# Altium schematic symbol library jlcpcb_2025_04_capacitors_extended_0603.schlib: 3668 symbols (part 18 of 20) (continued)
## GRM1885C2A332JA01D
designator C?  Capacitance: 3.3nF  (hidden comment: *)
Capacitor, Ceramic (MLCC), 3.3nF, ±5%, 100V, ±5%, SMD 0603; Manufacturer: Murata Electronics; Manufacturer Part Number: GRM1885C2A332JA01D; Package Size: 0603; JLCPCB Basic Part: No; JLCPCB Part Number: C710910; Supplier 1: LCSC; Category: Capacitors - MLCC; Supplier Part Number 1: C710910; Tolerance: ±5%; Voltage Rating: 100V; RoHS: Yes; ComponentLink1Description: Datasheet; ComponentLink1URL: https://wmsc.lcsc.com/wmsc/upload/file/pdf/v2/lcsc/2109092030_Murata-Electronics-GRM1885C2A332JA01D_C710910.pdf; ComponentLink2Description: JLCPCB Part URL; ComponentLink2URL: https://jlcpcb.com/partdetail/C710910; ComponentLink3Description: LCSC Part URL; ComponentLink3URL: https://lcsc.com/product-detail/Multilayer-Ceramic-Capacitors-MLCC---SMD-SMT_Murata-Electronics-Murata-Electronics-GRM1885C2A332JA01D_C710910.html
footprint CAP-0603 (0603 (1608M) Capacitor)
pins: 1, 2

## GRM1885C2A390JA01D
designator C?  Capacitance: 39pF  (hidden comment: *)
Capacitor, Ceramic (MLCC), 39pF, ±5%, 100V, null, ±5%, SMD 0603; Manufacturer: Murata Electronics; Manufacturer Part Number: GRM1885C2A390JA01D; Package Size: 0603; JLCPCB Basic Part: No; JLCPCB Part Number: C913637; Supplier 1: LCSC; Category: Capacitors - MLCC; Supplier Part Number 1: C913637; Tolerance: ±5%; Voltage Rating: 100V; Temperature Coefficient: null; RoHS: Yes; ComponentLink1Description: Datasheet; ComponentLink1URL: https://wmsc.lcsc.com/wmsc/upload/file/pdf/v2/lcsc/2201131300_Murata-Electronics-GRM1885C2A390JA01D_C913637.pdf; ComponentLink2Description: JLCPCB Part URL; ComponentLink2URL: https://jlcpcb.com/partdetail/C913637; ComponentLink3Description: LCSC Part URL; ComponentLink3URL: https://lcsc.com/product-detail/Multilayer-Ceramic-Capacitors-MLCC---SMD-SMT_Murata-Electronics-Murata-Electronics-GRM1885C2A390JA01D_C913637.html
footprint CAP-0603 (0603 (1608M) Capacitor)
pins: 1, 2

## GRM1885C2A821JA01D
designator C?  Capacitance: 820pF  (hidden comment: *)
Capacitor, Ceramic (MLCC), 820pF, ±5%, 100V, C0G, ±5%, SMD 0603; Manufacturer: Murata Electronics; Manufacturer Part Number: GRM1885C2A821JA01D; Package Size: 0603; JLCPCB Basic Part: No; JLCPCB Part Number: C117954; Supplier 1: LCSC; Category: Capacitors - MLCC; Supplier Part Number 1: C117954; Tolerance: ±5%; Voltage Rating: 100V; Temperature Coefficient: C0G; RoHS: Yes; ComponentLink1Description: Datasheet; ComponentLink1URL: https://wmsc.lcsc.com/wmsc/upload/file/pdf/v2/lcsc/2008031207_Murata-Electronics-GRM1885C2A821JA01D_C117954.pdf; ComponentLink2Description: JLCPCB Part URL; ComponentLink2URL: https://jlcpcb.com/partdetail/C117954; ComponentLink3Description: LCSC Part URL; ComponentLink3URL: https://lcsc.com/product-detail/Multilayer-Ceramic-Capacitors-MLCC---SMD-SMT_Murata-Electronics-Murata-Electronics-GRM1885C2A821JA01D_C117954.html
footprint CAP-0603 (0603 (1608M) Capacitor)
pins: 1, 2

## GRM1885C2AR50BA01D
designator C?  Capacitance: 0.5pF  (hidden comment: *)
Capacitor, Ceramic (MLCC), 0.5pF, 100V, C0G, SMD 0603; Manufacturer: Murata Electronics; Manufacturer Part Number: GRM1885C2AR50BA01D; Package Size: 0603; JLCPCB Basic Part: No; JLCPCB Part Number: C524623; Supplier 1: LCSC; Category: Capacitors - MLCC; Supplier Part Number 1: C524623; Voltage Rating: 100V; Temperature Coefficient: C0G; RoHS: Yes; ComponentLink1Description: Datasheet; ComponentLink1URL: https://wmsc.lcsc.com/wmsc/upload/file/pdf/v2/lcsc/2304140030_Murata-Electronics-GRM1885C2AR50BA01D_C524623.pdf; ComponentLink2Description: JLCPCB Part URL; ComponentLink2URL: https://jlcpcb.com/partdetail/C524623; ComponentLink3Description: LCSC Part URL; ComponentLink3URL: https://lcsc.com/product-detail/Multilayer-Ceramic-Capacitors-MLCC---SMD-SMT_Murata-Electronics-Murata-Electronics-GRM1885C2AR50BA01D_C524623.html
footprint CAP-0603 (0603 (1608M) Capacitor)
pins: 1, 2

## GRM1885C2AR50CA01D
designator C?  Capacitance: 0.5pF  (hidden comment: *)
Capacitor, Ceramic (MLCC), 0.5pF, 100V, C0G, SMD 0603; Manufacturer: Murata Electronics; Manufacturer Part Number: GRM1885C2AR50CA01D; Package Size: 0603; JLCPCB Basic Part: No; JLCPCB Part Number: C692633; Supplier 1: LCSC; Category: Capacitors - MLCC; Supplier Part Number 1: C692633; Voltage Rating: 100V; Temperature Coefficient: C0G; RoHS: Yes; ComponentLink1Description: Datasheet; ComponentLink2Description: JLCPCB Part URL; ComponentLink2URL: https://jlcpcb.com/partdetail/C692633; ComponentLink3Description: LCSC Part URL; ComponentLink3URL: https://lcsc.com/product-detail/Multilayer-Ceramic-Capacitors-MLCC---SMD-SMT_Murata-Electronics-Murata-Electronics-GRM1885C2AR50CA01D_C692633.html
footprint CAP-0603 (0603 (1608M) Capacitor)
pins: 1, 2

## GRM1885C2E470JW07D
designator C?  Capacitance: 47pF  (hidden comment: *)
Capacitor, Ceramic (MLCC), 47pF, ±5%, 250V, ±5%, SMD 0603; Manufacturer: Murata Electronics; Manufacturer Part Number: GRM1885C2E470JW07D; Package Size: 0603; JLCPCB Basic Part: No; JLCPCB Part Number: C907914; Supplier 1: LCSC; Category: Capacitors - MLCC; Supplier Part Number 1: C907914; Tolerance: ±5%; Voltage Rating: 250V; RoHS: Yes; ComponentLink1Description: Datasheet; ComponentLink1URL: https://wmsc.lcsc.com/wmsc/upload/file/pdf/v2/lcsc/2201242100_Murata-Electronics-GRM1885C2E470JW07D_C907914.pdf; ComponentLink2Description: JLCPCB Part URL; ComponentLink2URL: https://jlcpcb.com/partdetail/C907914; ComponentLink3Description: LCSC Part URL; ComponentLink3URL: https://lcsc.com/product-detail/Multilayer-Ceramic-Capacitors-MLCC---SMD-SMT_Murata-Electronics-Murata-Electronics-GRM1885C2E470JW07D_C907914.html
footprint CAP-0603 (0603 (1608M) Capacitor)
pins: 1, 2

## GRM1887U1H102JA01D
designator C?  Capacitance: 1nF  (hidden comment: *)
Capacitor, Ceramic (MLCC), 1nF, ±5%, 50V, U2J, ±5%, SMD 0603; Manufacturer: Murata Electronics; Manufacturer Part Number: GRM1887U1H102JA01D; Package Size: 0603; JLCPCB Basic Part: No; JLCPCB Part Number: C162262; Supplier 1: LCSC; Category: Capacitors - MLCC; Supplier Part Number 1: C162262; Tolerance: ±5%; Voltage Rating: 50V; Temperature Coefficient: U2J; RoHS: Yes; ComponentLink1Description: Datasheet; ComponentLink1URL: https://wmsc.lcsc.com/wmsc/upload/file/pdf/v2/lcsc/2304140030_Murata-Electronics-GRM1887U1H102JA01D_C162262.pdf; ComponentLink2Description: JLCPCB Part URL; ComponentLink2URL: https://jlcpcb.com/partdetail/C162262; ComponentLink3Description: LCSC Part URL; ComponentLink3URL: https://lcsc.com/product-detail/Multilayer-Ceramic-Capacitors-MLCC---SMD-SMT_Murata-Electronics-Murata-Electronics-GRM1887U1H102JA01D_C162262.html
footprint CAP-0603 (0603 (1608M) Capacitor)
pins: 1, 2

## GRM1887U1H103JA01D
designator C?  Capacitance: 10nF  (hidden comment: *)
Capacitor, Ceramic (MLCC), 10nF, ±5%, null, U2J, ±5%, SMD 0603; Manufacturer: Murata Electronics; Manufacturer Part Number: GRM1887U1H103JA01D; Package Size: 0603; JLCPCB Basic Part: No; JLCPCB Part Number: C783279; Supplier 1: LCSC; Category: Capacitors - MLCC; Supplier Part Number 1: C783279; Tolerance: ±5%; Voltage Rating: null; Temperature Coefficient: U2J; RoHS: Yes; ComponentLink1Description: Datasheet; ComponentLink1URL: https://wmsc.lcsc.com/wmsc/upload/file/pdf/v2/lcsc/2304140030_Murata-Electronics-GRM1887U1H103JA01D_C783279.pdf; ComponentLink2Description: JLCPCB Part URL; ComponentLink2URL: https://jlcpcb.com/partdetail/C783279; ComponentLink3Description: LCSC Part URL; ComponentLink3URL: https://lcsc.com/product-detail/Multilayer-Ceramic-Capacitors-MLCC---SMD-SMT_Murata-Electronics-Murata-Electronics-GRM1887U1H103JA01D_C783279.html
footprint CAP-0603 (0603 (1608M) Capacitor)
pins: 1, 2

## GRT188C8YA105KE13D
designator C?  Capacitance: 1uF  (hidden comment: *)
Capacitor, Ceramic (MLCC), 1uF, ±10%, 35V, X6S, ±10%, SMD 0603; Manufacturer: Murata Electronics; Manufacturer Part Number: GRT188C8YA105KE13D; Package Size: 0603; JLCPCB Basic Part: No; JLCPCB Part Number: C711096; Supplier 1: LCSC; Category: Capacitors - MLCC; Supplier Part Number 1: C711096; Tolerance: ±10%; Voltage Rating: 35V; Temperature Coefficient: X6S; RoHS: Yes; ComponentLink1Description: Datasheet; ComponentLink1URL: https://wmsc.lcsc.com/wmsc/upload/file/pdf/v2/lcsc/2210190600_Murata-Electronics-GRT188C8YA105KE13D_C711096.pdf; ComponentLink2Description: JLCPCB Part URL; ComponentLink2URL: https://jlcpcb.com/partdetail/C711096; ComponentLink3Description: LCSC Part URL; ComponentLink3URL: https://lcsc.com/product-detail/Multilayer-Ceramic-Capacitors-MLCC---SMD-SMT_Murata-Electronics-Murata-Electronics-GRT188C8YA105KE13D_C711096.html
footprint CAP-0603 (0603 (1608M) Capacitor)
pins: 1, 2

## GRT188C8YA225KE13D
designator C?  Capacitance: 2.2uF  (hidden comment: *)
Capacitor, Ceramic (MLCC), 2.2uF, ±10%, 35V, X6S, ±10%, SMD 0603; Manufacturer: Murata Electronics; Manufacturer Part Number: GRT188C8YA225KE13D; Package Size: 0603; JLCPCB Basic Part: No; JLCPCB Part Number: C711097; Supplier 1: LCSC; Category: Capacitors - MLCC; Supplier Part Number 1: C711097; Tolerance: ±10%; Voltage Rating: 35V; Temperature Coefficient: X6S; RoHS: Yes; ComponentLink1Description: Datasheet; ComponentLink1URL: https://wmsc.lcsc.com/wmsc/upload/file/pdf/v2/lcsc/2210190600_Murata-Electronics-GRT188C8YA225KE13D_C711097.pdf; ComponentLink2Description: JLCPCB Part URL; ComponentLink2URL: https://jlcpcb.com/partdetail/C711097; ComponentLink3Description: LCSC Part URL; ComponentLink3URL: https://lcsc.com/product-detail/Multilayer-Ceramic-Capacitors-MLCC---SMD-SMT_Murata-Electronics-Murata-Electronics-GRT188C8YA225KE13D_C711097.html
footprint CAP-0603 (0603 (1608M) Capacitor)
pins: 1, 2

## GRT188C71C225KE13D
designator C?  Capacitance: 2.2uF  (hidden comment: *)
Capacitor, Ceramic (MLCC), 2.2uF, ±10%, 16V, ±10%, SMD 0603; Manufacturer: Murata Electronics; Manufacturer Part Number: GRT188C71C225KE13D; Package Size: 0603; JLCPCB Basic Part: No; JLCPCB Part Number: C883577; Supplier 1: LCSC; Category: Capacitors - MLCC; Supplier Part Number 1: C883577; Tolerance: ±10%; Voltage Rating: 16V; RoHS: Yes; ComponentLink1Description: Datasheet; ComponentLink1URL: https://wmsc.lcsc.com/wmsc/upload/file/pdf/v2/lcsc/2304140030_Murata-Electronics-GRT188C71C225KE13D_C883577.pdf; ComponentLink2Description: JLCPCB Part URL; ComponentLink2URL: https://jlcpcb.com/partdetail/C883577; ComponentLink3Description: LCSC Part URL; ComponentLink3URL: https://lcsc.com/product-detail/Multilayer-Ceramic-Capacitors-MLCC---SMD-SMT_Murata-Electronics-Murata-Electronics-GRT188C71C225KE13D_C883577.html
footprint CAP-0603 (0603 (1608M) Capacitor)
pins: 1, 2

## GRT188C71C475KE13D
designator C?  Capacitance: 4.7uF  (hidden comment: *)
Capacitor, Ceramic (MLCC), 4.7uF, ±10%, 16V, X7S, ±10%, SMD 0603; Manufacturer: Murata Electronics; Manufacturer Part Number: GRT188C71C475KE13D; Package Size: 0603; JLCPCB Basic Part: No; JLCPCB Part Number: C5160228; Supplier 1: LCSC; Category: Capacitors - MLCC; Supplier Part Number 1: C5160228; Tolerance: ±10%; Voltage Rating: 16V; Temperature Coefficient: X7S; RoHS: Yes; ComponentLink1Description: Datasheet; ComponentLink1URL: https://wmsc.lcsc.com/wmsc/upload/file/pdf/v2/lcsc/2209141730_Murata-Electronics-GRT188C71C475KE13D_C5160228.pdf; ComponentLink2Description: JLCPCB Part URL; ComponentLink2URL: https://jlcpcb.com/partdetail/C5160228; ComponentLink3Description: LCSC Part URL; ComponentLink3URL: https://lcsc.com/product-detail/Multilayer-Ceramic-Capacitors-MLCC---SMD-SMT_Murata-Electronics-Murata-Electronics-GRT188C71C475KE13D_C5160228.html
footprint CAP-0603 (0603 (1608M) Capacitor)
pins: 1, 2

## GRT188C71E225KE13D
designator C?  Capacitance: 2.2uF  (hidden comment: *)
Capacitor, Ceramic (MLCC), 2.2uF, ±10%, 25V, X7S, ±10%, SMD 0603; Manufacturer: Murata Electronics; Manufacturer Part Number: GRT188C71E225KE13D; Package Size: 0603; JLCPCB Basic Part: No; JLCPCB Part Number: C5299755; Supplier 1: LCSC; Category: Capacitors - MLCC; Supplier Part Number 1: C5299755; Tolerance: ±10%; Voltage Rating: 25V; Temperature Coefficient: X7S; RoHS: Yes; ComponentLink1Description: Datasheet; ComponentLink1URL: https://wmsc.lcsc.com/wmsc/upload/file/pdf/v2/lcsc/2212191030_Murata-Electronics-GRT188C71E225KE13D_C5299755.pdf; ComponentLink2Description: JLCPCB Part URL; ComponentLink2URL: https://jlcpcb.com/partdetail/C5299755; ComponentLink3Description: LCSC Part URL; ComponentLink3URL: https://lcsc.com/product-detail/Multilayer-Ceramic-Capacitors-MLCC---SMD-SMT_Murata-Electronics-Murata-Electronics-GRT188C71E225KE13D_C5299755.html
footprint CAP-0603 (0603 (1608M) Capacitor)
pins: 1, 2

## GRT188C80J106ME13D
designator C?  Capacitance: 10uF  (hidden comment: *)
Capacitor, Ceramic (MLCC), 10uF, 6.3V, X6S, SMD 0603; Manufacturer: Murata Electronics; Manufacturer Part Number: GRT188C80J106ME13D; Package Size: 0603; JLCPCB Basic Part: No; JLCPCB Part Number: C2918259; Supplier 1: LCSC; Category: Capacitors - MLCC; Supplier Part Number 1: C2918259; Voltage Rating: 6.3V; Temperature Coefficient: X6S; RoHS: Yes; ComponentLink1Description: Datasheet; ComponentLink1URL: https://wmsc.lcsc.com/wmsc/upload/file/pdf/v2/lcsc/2111181830_Murata-Electronics-GRT188C80J106ME13D_C2918259.pdf; ComponentLink2Description: JLCPCB Part URL; ComponentLink2URL: https://jlcpcb.com/partdetail/C2918259; ComponentLink3Description: LCSC Part URL; ComponentLink3URL: https://lcsc.com/product-detail/Multilayer-Ceramic-Capacitors-MLCC---SMD-SMT_Murata-Electronics-Murata-Electronics-GRT188C80J106ME13D_C2918259.html
footprint CAP-0603 (0603 (1608M) Capacitor)
pins: 1, 2

## GRT188C80J226ME13D
designator C?  Capacitance: 22uF  (hidden comment: *)
Capacitor, Ceramic (MLCC), 22uF, ±20%, 6.3V, X6S, ±20%, SMD 0603; Manufacturer: Murata Electronics; Manufacturer Part Number: GRT188C80J226ME13D; Package Size: 0603; JLCPCB Basic Part: No; JLCPCB Part Number: C703102; Supplier 1: LCSC; Category: Capacitors - MLCC; Supplier Part Number 1: C703102; Tolerance: ±20%; Voltage Rating: 6.3V; Temperature Coefficient: X6S; RoHS: Yes; ComponentLink1Description: Datasheet; ComponentLink1URL: https://wmsc.lcsc.com/wmsc/upload/file/pdf/v2/lcsc/2209061430_Murata-Electronics-GRT188C80J226ME13D_C703102.pdf; ComponentLink2Description: JLCPCB Part URL; ComponentLink2URL: https://jlcpcb.com/partdetail/C703102; ComponentLink3Description: LCSC Part URL; ComponentLink3URL: https://lcsc.com/product-detail/Multilayer-Ceramic-Capacitors-MLCC---SMD-SMT_Murata-Electronics-Murata-Electronics-GRT188C80J226ME13D_C703102.html
footprint CAP-0603 (0603 (1608M) Capacitor)
pins: 1, 2

## GRT188C80J475KE01D
designator C?  Capacitance: 4.7uF  (hidden comment: *)
Capacitor, Ceramic (MLCC), 4.7uF, ±10%, 6.3V, X6S, ±10%, SMD 0603; Manufacturer: Murata Electronics; Manufacturer Part Number: GRT188C80J475KE01D; Package Size: 0603; JLCPCB Basic Part: No; JLCPCB Part Number: C711094; Supplier 1: LCSC; Category: Capacitors - MLCC; Supplier Part Number 1: C711094; Tolerance: ±10%; Voltage Rating: 6.3V; Temperature Coefficient: X6S; RoHS: Yes; ComponentLink1Description: Datasheet; ComponentLink1URL: https://wmsc.lcsc.com/wmsc/upload/file/pdf/v2/lcsc/2308111644_Murata-Electronics-GRT188C80J475KE01D_C711094.pdf; ComponentLink2Description: JLCPCB Part URL; ComponentLink2URL: https://jlcpcb.com/partdetail/C711094; ComponentLink3Description: LCSC Part URL; ComponentLink3URL: https://lcsc.com/product-detail/Multilayer-Ceramic-Capacitors-MLCC---SMD-SMT_Murata-Electronics-Murata-Electronics-GRT188C80J475KE01D_C711094.html
footprint CAP-0603 (0603 (1608M) Capacitor)
pins: 1, 2

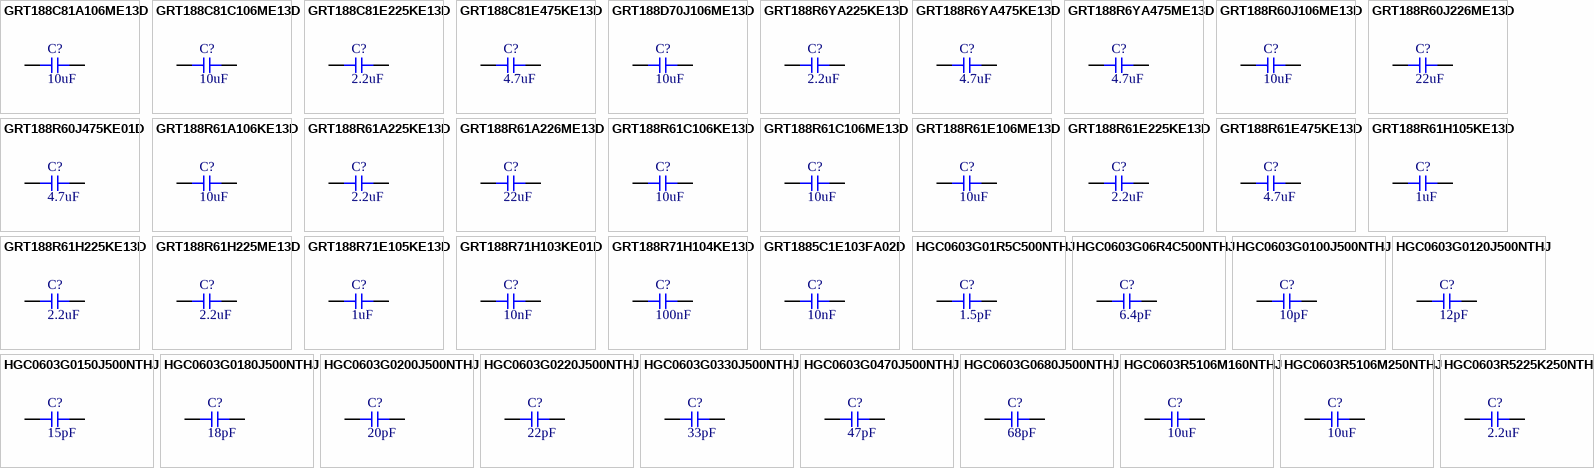
[diagram p80: symbols GRT188C81A106ME13D to HGC0603R5225K250NTHJ]

## GRT188C81A106ME13D
designator C?  Capacitance: 10uF  (hidden comment: *)
Capacitor, Ceramic (MLCC), 10uF, ±20%, 10V, X6S, ±20%, SMD 0603; Manufacturer: Murata Electronics; Manufacturer Part Number: GRT188C81A106ME13D; Package Size: 0603; JLCPCB Basic Part: No; JLCPCB Part Number: C711095; Supplier 1: LCSC; Category: Capacitors - MLCC; Supplier Part Number 1: C711095; Tolerance: ±20%; Voltage Rating: 10V; Temperature Coefficient: X6S; RoHS: Yes; ComponentLink1Description: Datasheet; ComponentLink1URL: https://wmsc.lcsc.com/wmsc/upload/file/pdf/v2/lcsc/2108182030_Murata-Electronics-GRT188C81A106ME13D_C711095.pdf; ComponentLink2Description: JLCPCB Part URL; ComponentLink2URL: https://jlcpcb.com/partdetail/C711095; ComponentLink3Description: LCSC Part URL; ComponentLink3URL: https://lcsc.com/product-detail/Multilayer-Ceramic-Capacitors-MLCC---SMD-SMT_Murata-Electronics-Murata-Electronics-GRT188C81A106ME13D_C711095.html
footprint CAP-0603 (0603 (1608M) Capacitor)
pins: 1, 2

## GRT188C81C106ME13D
designator C?  Capacitance: 10uF  (hidden comment: *)
Capacitor, Ceramic (MLCC), 10uF, ±20%, 16V, ±20%, SMD 0603; Manufacturer: Murata Electronics; Manufacturer Part Number: GRT188C81C106ME13D; Package Size: 0603; JLCPCB Basic Part: No; JLCPCB Part Number: C703081; Supplier 1: LCSC; Category: Capacitors - MLCC; Supplier Part Number 1: C703081; Tolerance: ±20%; Voltage Rating: 16V; RoHS: Yes; ComponentLink1Description: Datasheet; ComponentLink1URL: https://wmsc.lcsc.com/wmsc/upload/file/pdf/v2/lcsc/2308111644_Murata-Electronics-GRT188C81C106ME13D_C703081.pdf; ComponentLink2Description: JLCPCB Part URL; ComponentLink2URL: https://jlcpcb.com/partdetail/C703081; ComponentLink3Description: LCSC Part URL; ComponentLink3URL: https://lcsc.com/product-detail/Multilayer-Ceramic-Capacitors-MLCC---SMD-SMT_Murata-Electronics-Murata-Electronics-GRT188C81C106ME13D_C703081.html
footprint CAP-0603 (0603 (1608M) Capacitor)
pins: 1, 2

## GRT188C81E225KE13D
designator C?  Capacitance: 2.2uF  (hidden comment: *)
Capacitor, Ceramic (MLCC), 2.2uF, ±10%, 25V, X6S, ±10%, SMD 0603; Manufacturer: Murata Electronics; Manufacturer Part Number: GRT188C81E225KE13D; Package Size: 0603; JLCPCB Basic Part: No; JLCPCB Part Number: C907915; Supplier 1: LCSC; Category: Capacitors - MLCC; Supplier Part Number 1: C907915; Tolerance: ±10%; Voltage Rating: 25V; Temperature Coefficient: X6S; RoHS: Yes; ComponentLink1Description: Datasheet; ComponentLink1URL: https://wmsc.lcsc.com/wmsc/upload/file/pdf/v2/lcsc/2304140030_Murata-Electronics-GRT188C81E225KE13D_C907915.pdf; ComponentLink2Description: JLCPCB Part URL; ComponentLink2URL: https://jlcpcb.com/partdetail/C907915; ComponentLink3Description: LCSC Part URL; ComponentLink3URL: https://lcsc.com/product-detail/Multilayer-Ceramic-Capacitors-MLCC---SMD-SMT_Murata-Electronics-Murata-Electronics-GRT188C81E225KE13D_C907915.html
footprint CAP-0603 (0603 (1608M) Capacitor)
pins: 1, 2

## GRT188C81E475KE13D
designator C?  Capacitance: 4.7uF  (hidden comment: *)
Capacitor, Ceramic (MLCC), 4.7uF, ±10%, 25V, ±10%, SMD 0603; Manufacturer: Murata Electronics; Manufacturer Part Number: GRT188C81E475KE13D; Package Size: 0603; JLCPCB Basic Part: No; JLCPCB Part Number: C907917; Supplier 1: LCSC; Category: Capacitors - MLCC; Supplier Part Number 1: C907917; Tolerance: ±10%; Voltage Rating: 25V; RoHS: Yes; ComponentLink1Description: Datasheet; ComponentLink1URL: https://wmsc.lcsc.com/wmsc/upload/file/pdf/v2/lcsc/2304140030_Murata-Electronics-GRT188C81E475KE13D_C907917.pdf; ComponentLink2Description: JLCPCB Part URL; ComponentLink2URL: https://jlcpcb.com/partdetail/C907917; ComponentLink3Description: LCSC Part URL; ComponentLink3URL: https://lcsc.com/product-detail/Multilayer-Ceramic-Capacitors-MLCC---SMD-SMT_Murata-Electronics-Murata-Electronics-GRT188C81E475KE13D_C907917.html
footprint CAP-0603 (0603 (1608M) Capacitor)
pins: 1, 2

## GRT188D70J106ME13D
designator C?  Capacitance: 10uF  (hidden comment: *)
Capacitor, Ceramic (MLCC), 10uF, ±20%, 6.3V, X7T, ±20%, SMD 0603; Manufacturer: Murata Electronics; Manufacturer Part Number: GRT188D70J106ME13D; Package Size: 0603; JLCPCB Basic Part: No; JLCPCB Part Number: C3907775; Supplier 1: LCSC; Category: Capacitors - MLCC; Supplier Part Number 1: C3907775; Tolerance: ±20%; Voltage Rating: 6.3V; Temperature Coefficient: X7T; RoHS: Yes; ComponentLink1Description: Datasheet; ComponentLink1URL: https://wmsc.lcsc.com/wmsc/upload/file/pdf/v2/lcsc/2308111808_Murata-Electronics-GRT188D70J106ME13D_C3907775.pdf; ComponentLink2Description: JLCPCB Part URL; ComponentLink2URL: https://jlcpcb.com/partdetail/C3907775; ComponentLink3Description: LCSC Part URL; ComponentLink3URL: https://lcsc.com/product-detail/Multilayer-Ceramic-Capacitors-MLCC---SMD-SMT_Murata-Electronics-Murata-Electronics-GRT188D70J106ME13D_C3907775.html
footprint CAP-0603 (0603 (1608M) Capacitor)
pins: 1, 2

## GRT188R6YA225KE13D
designator C?  Capacitance: 2.2uF  (hidden comment: *)
Capacitor, Ceramic (MLCC), 2.2uF, ±10%, 35V, X5R, ±10%, SMD 0603; Manufacturer: Murata Electronics; Manufacturer Part Number: GRT188R6YA225KE13D; Package Size: 0603; JLCPCB Basic Part: No; JLCPCB Part Number: C711099; Supplier 1: LCSC; Category: Capacitors - MLCC; Supplier Part Number 1: C711099; Tolerance: ±10%; Voltage Rating: 35V; Temperature Coefficient: X5R; RoHS: Yes; ComponentLink1Description: Datasheet; ComponentLink1URL: https://wmsc.lcsc.com/wmsc/upload/file/pdf/v2/lcsc/2210190600_Murata-Electronics-GRT188R6YA225KE13D_C711099.pdf; ComponentLink2Description: JLCPCB Part URL; ComponentLink2URL: https://jlcpcb.com/partdetail/C711099; ComponentLink3Description: LCSC Part URL; ComponentLink3URL: https://lcsc.com/product-detail/Multilayer-Ceramic-Capacitors-MLCC---SMD-SMT_Murata-Electronics-Murata-Electronics-GRT188R6YA225KE13D_C711099.html
footprint CAP-0603 (0603 (1608M) Capacitor)
pins: 1, 2

## GRT188R6YA475KE13D
designator C?  Capacitance: 4.7uF  (hidden comment: *)
Capacitor, Ceramic (MLCC), 4.7uF, ±10%, 35V, X5R, ±10%, SMD 0603; Manufacturer: Murata Electronics; Manufacturer Part Number: GRT188R6YA475KE13D; Package Size: 0603; JLCPCB Basic Part: No; JLCPCB Part Number: C711100; Supplier 1: LCSC; Category: Capacitors - MLCC; Supplier Part Number 1: C711100; Tolerance: ±10%; Voltage Rating: 35V; Temperature Coefficient: X5R; RoHS: Yes; ComponentLink1Description: Datasheet; ComponentLink1URL: https://wmsc.lcsc.com/wmsc/upload/file/pdf/v2/lcsc/2204211715_Murata-Electronics-GRT188R6YA475KE13D_C711100.pdf; ComponentLink2Description: JLCPCB Part URL; ComponentLink2URL: https://jlcpcb.com/partdetail/C711100; ComponentLink3Description: LCSC Part URL; ComponentLink3URL: https://lcsc.com/product-detail/Multilayer-Ceramic-Capacitors-MLCC---SMD-SMT_Murata-Electronics-Murata-Electronics-GRT188R6YA475KE13D_C711100.html
footprint CAP-0603 (0603 (1608M) Capacitor)
pins: 1, 2

## GRT188R6YA475ME13D
designator C?  Capacitance: 4.7uF  (hidden comment: *)
Capacitor, Ceramic (MLCC), 4.7uF, ±20%, 35V, X5R, ±20%, SMD 0603; Manufacturer: Murata Electronics; Manufacturer Part Number: GRT188R6YA475ME13D; Package Size: 0603; JLCPCB Basic Part: No; JLCPCB Part Number: C907729; Supplier 1: LCSC; Category: Capacitors - MLCC; Supplier Part Number 1: C907729; Tolerance: ±20%; Voltage Rating: 35V; Temperature Coefficient: X5R; RoHS: Yes; ComponentLink1Description: Datasheet; ComponentLink1URL: https://wmsc.lcsc.com/wmsc/upload/file/pdf/v2/lcsc/2304140030_Murata-Electronics-GRT188R6YA475ME13D_C907729.pdf; ComponentLink2Description: JLCPCB Part URL; ComponentLink2URL: https://jlcpcb.com/partdetail/C907729; ComponentLink3Description: LCSC Part URL; ComponentLink3URL: https://lcsc.com/product-detail/Multilayer-Ceramic-Capacitors-MLCC---SMD-SMT_Murata-Electronics-Murata-Electronics-GRT188R6YA475ME13D_C907729.html
footprint CAP-0603 (0603 (1608M) Capacitor)
pins: 1, 2

## GRT188R60J106ME13D
designator C?  Capacitance: 10uF  (hidden comment: *)
Capacitor, Ceramic (MLCC), 10uF, ±20%, 6.3V, X5R, ±20%, SMD 0603; Manufacturer: Murata Electronics; Manufacturer Part Number: GRT188R60J106ME13D; Package Size: 0603; JLCPCB Basic Part: No; JLCPCB Part Number: C193747; Supplier 1: LCSC; Category: Capacitors - MLCC; Supplier Part Number 1: C193747; Tolerance: ±20%; Voltage Rating: 6.3V; Temperature Coefficient: X5R; RoHS: Yes; ComponentLink1Description: Datasheet; ComponentLink1URL: https://wmsc.lcsc.com/wmsc/upload/file/pdf/v2/lcsc/2012231209_Murata-Electronics-GRT188R60J106ME13D_C193747.pdf; ComponentLink2Description: JLCPCB Part URL; ComponentLink2URL: https://jlcpcb.com/partdetail/C193747; ComponentLink3Description: LCSC Part URL; ComponentLink3URL: https://lcsc.com/product-detail/Multilayer-Ceramic-Capacitors-MLCC---SMD-SMT_Murata-Electronics-Murata-Electronics-GRT188R60J106ME13D_C193747.html
footprint CAP-0603 (0603 (1608M) Capacitor)
pins: 1, 2

## GRT188R60J226ME13D
designator C?  Capacitance: 22uF  (hidden comment: *)
Capacitor, Ceramic (MLCC), 22uF, ±20%, 6.3V, X5R, ±20%, SMD 0603; Manufacturer: Murata Electronics; Manufacturer Part Number: GRT188R60J226ME13D; Package Size: 0603; JLCPCB Basic Part: No; JLCPCB Part Number: C126628; Supplier 1: LCSC; Category: Capacitors - MLCC; Supplier Part Number 1: C126628; Tolerance: ±20%; Voltage Rating: 6.3V; Temperature Coefficient: X5R; RoHS: Yes; ComponentLink1Description: Datasheet; ComponentLink1URL: https://wmsc.lcsc.com/wmsc/upload/file/pdf/v2/lcsc/1810311135_Murata-Electronics-GRT188R60J226ME13D_C126628.pdf; ComponentLink2Description: JLCPCB Part URL; ComponentLink2URL: https://jlcpcb.com/partdetail/C126628; ComponentLink3Description: LCSC Part URL; ComponentLink3URL: https://lcsc.com/product-detail/Multilayer-Ceramic-Capacitors-MLCC---SMD-SMT_Murata-Electronics-Murata-Electronics-GRT188R60J226ME13D_C126628.html
footprint CAP-0603 (0603 (1608M) Capacitor)
pins: 1, 2

## GRT188R60J475KE01D
designator C?  Capacitance: 4.7uF  (hidden comment: *)
Capacitor, Ceramic (MLCC), 4.7uF, ±10%, 6.3V, X5R, ±10%, SMD 0603; Manufacturer: Murata Electronics; Manufacturer Part Number: GRT188R60J475KE01D; Package Size: 0603; JLCPCB Basic Part: No; JLCPCB Part Number: C126629; Supplier 1: LCSC; Category: Capacitors - MLCC; Supplier Part Number 1: C126629; Tolerance: ±10%; Voltage Rating: 6.3V; Temperature Coefficient: X5R; RoHS: Yes; ComponentLink1Description: Datasheet; ComponentLink1URL: https://wmsc.lcsc.com/wmsc/upload/file/pdf/v2/lcsc/1810311120_Murata-Electronics-GRT188R60J475KE01D_C126629.pdf; ComponentLink2Description: JLCPCB Part URL; ComponentLink2URL: https://jlcpcb.com/partdetail/C126629; ComponentLink3Description: LCSC Part URL; ComponentLink3URL: https://lcsc.com/product-detail/Multilayer-Ceramic-Capacitors-MLCC---SMD-SMT_Murata-Electronics-Murata-Electronics-GRT188R60J475KE01D_C126629.html
footprint CAP-0603 (0603 (1608M) Capacitor)
pins: 1, 2

## GRT188R61A106KE13D
designator C?  Capacitance: 10uF  (hidden comment: *)
Capacitor, Ceramic (MLCC), 10uF, ±10%, 10V, ±10%, SMD 0603; Manufacturer: Murata Electronics; Manufacturer Part Number: GRT188R61A106KE13D; Package Size: 0603; JLCPCB Basic Part: No; JLCPCB Part Number: C782172; Supplier 1: LCSC; Category: Capacitors - MLCC; Supplier Part Number 1: C782172; Tolerance: ±10%; Voltage Rating: 10V; RoHS: Yes; ComponentLink1Description: Datasheet; ComponentLink1URL: https://wmsc.lcsc.com/wmsc/upload/file/pdf/v2/lcsc/2009161209_Murata-Electronics-GRT188R61A106KE13D_C782172.pdf; ComponentLink2Description: JLCPCB Part URL; ComponentLink2URL: https://jlcpcb.com/partdetail/C782172; ComponentLink3Description: LCSC Part URL; ComponentLink3URL: https://lcsc.com/product-detail/Multilayer-Ceramic-Capacitors-MLCC---SMD-SMT_Murata-Electronics-Murata-Electronics-GRT188R61A106KE13D_C782172.html
footprint CAP-0603 (0603 (1608M) Capacitor)
pins: 1, 2

## GRT188R61A225KE13D
designator C?  Capacitance: 2.2uF  (hidden comment: *)
Capacitor, Ceramic (MLCC), 2.2uF, ±10%, 10V, X5R, ±10%, SMD 0603; Manufacturer: Murata Electronics; Manufacturer Part Number: GRT188R61A225KE13D; Package Size: 0603; JLCPCB Basic Part: No; JLCPCB Part Number: C363935; Supplier 1: LCSC; Category: Capacitors - MLCC; Supplier Part Number 1: C363935; Tolerance: ±10%; Voltage Rating: 10V; Temperature Coefficient: X5R; RoHS: Yes; ComponentLink1Description: Datasheet; ComponentLink1URL: https://wmsc.lcsc.com/wmsc/upload/file/pdf/v2/lcsc/1912111437_Murata-Electronics-GRT188R61A225KE13D_C363935.pdf; ComponentLink2Description: JLCPCB Part URL; ComponentLink2URL: https://jlcpcb.com/partdetail/C363935; ComponentLink3Description: LCSC Part URL; ComponentLink3URL: https://lcsc.com/product-detail/Multilayer-Ceramic-Capacitors-MLCC---SMD-SMT_Murata-Electronics-Murata-Electronics-GRT188R61A225KE13D_C363935.html
footprint CAP-0603 (0603 (1608M) Capacitor)
pins: 1, 2

## GRT188R61A226ME13D
designator C?  Capacitance: 22uF  (hidden comment: *)
Capacitor, Ceramic (MLCC), 22uF, ±20%, 10V, X5R, ±20%, SMD 0603; Manufacturer: Murata Electronics; Manufacturer Part Number: GRT188R61A226ME13D; Package Size: 0603; JLCPCB Basic Part: No; JLCPCB Part Number: C126630; Supplier 1: LCSC; Category: Capacitors - MLCC; Supplier Part Number 1: C126630; Tolerance: ±20%; Voltage Rating: 10V; Temperature Coefficient: X5R; RoHS: Yes; ComponentLink1Description: Datasheet; ComponentLink1URL: https://wmsc.lcsc.com/wmsc/upload/file/pdf/v2/lcsc/1810311120_Murata-Electronics-GRT188R61A226ME13D_C126630.pdf; ComponentLink2Description: JLCPCB Part URL; ComponentLink2URL: https://jlcpcb.com/partdetail/C126630; ComponentLink3Description: LCSC Part URL; ComponentLink3URL: https://lcsc.com/product-detail/Multilayer-Ceramic-Capacitors-MLCC---SMD-SMT_Murata-Electronics-Murata-Electronics-GRT188R61A226ME13D_C126630.html
footprint CAP-0603 (0603 (1608M) Capacitor)
pins: 1, 2

## GRT188R61C106KE13D
designator C?  Capacitance: 10uF  (hidden comment: *)
Capacitor, Ceramic (MLCC), 10uF, ±10%, 16V, ±10%, SMD 0603; Manufacturer: Murata Electronics; Manufacturer Part Number: GRT188R61C106KE13D; Package Size: 0603; JLCPCB Basic Part: No; JLCPCB Part Number: C711098; Supplier 1: LCSC; Category: Capacitors - MLCC; Supplier Part Number 1: C711098; Tolerance: ±10%; Voltage Rating: 16V; RoHS: Yes; ComponentLink1Description: Datasheet; ComponentLink1URL: https://wmsc.lcsc.com/wmsc/upload/file/pdf/v2/lcsc/2009181536_Murata-Electronics-GRT188R61C106KE13D_C711098.pdf; ComponentLink2Description: JLCPCB Part URL; ComponentLink2URL: https://jlcpcb.com/partdetail/C711098; ComponentLink3Description: LCSC Part URL; ComponentLink3URL: https://lcsc.com/product-detail/Multilayer-Ceramic-Capacitors-MLCC---SMD-SMT_Murata-Electronics-Murata-Electronics-GRT188R61C106KE13D_C711098.html
footprint CAP-0603 (0603 (1608M) Capacitor)
pins: 1, 2

## GRT188R61C106ME13D
designator C?  Capacitance: 10uF  (hidden comment: *)
Capacitor, Ceramic (MLCC), 10uF, ±20%, 16V, ±20%, SMD 0603; Manufacturer: Murata Electronics; Manufacturer Part Number: GRT188R61C106ME13D; Package Size: 0603; JLCPCB Basic Part: No; JLCPCB Part Number: C2168010; Supplier 1: LCSC; Category: Capacitors - MLCC; Supplier Part Number 1: C2168010; Tolerance: ±20%; Voltage Rating: 16V; RoHS: Yes; ComponentLink1Description: Datasheet; ComponentLink1URL: https://wmsc.lcsc.com/wmsc/upload/file/pdf/v2/lcsc/2202040300_Murata-Electronics-GRT188R61C106ME13D_C2168010.pdf; ComponentLink2Description: JLCPCB Part URL; ComponentLink2URL: https://jlcpcb.com/partdetail/C2168010; ComponentLink3Description: LCSC Part URL; ComponentLink3URL: https://lcsc.com/product-detail/Multilayer-Ceramic-Capacitors-MLCC---SMD-SMT_Murata-Electronics-Murata-Electronics-GRT188R61C106ME13D_C2168010.html
footprint CAP-0603 (0603 (1608M) Capacitor)
pins: 1, 2

## GRT188R61E106ME13D
designator C?  Capacitance: 10uF  (hidden comment: *)
Capacitor, Ceramic (MLCC), 10uF, ±20%, 25V, X5R, ±20%, SMD 0603; Manufacturer: Murata Electronics; Manufacturer Part Number: GRT188R61E106ME13D; Package Size: 0603; JLCPCB Basic Part: No; JLCPCB Part Number: C697423; Supplier 1: LCSC; Category: Capacitors - MLCC; Supplier Part Number 1: C697423; Tolerance: ±20%; Voltage Rating: 25V; Temperature Coefficient: X5R; RoHS: Yes; ComponentLink1Description: Datasheet; ComponentLink1URL: https://wmsc.lcsc.com/wmsc/upload/file/pdf/v2/lcsc/2007131538_Murata-Electronics-GRT188R61E106ME13D_C697423.pdf; ComponentLink2Description: JLCPCB Part URL; ComponentLink2URL: https://jlcpcb.com/partdetail/C697423; ComponentLink3Description: LCSC Part URL; ComponentLink3URL: https://lcsc.com/product-detail/Multilayer-Ceramic-Capacitors-MLCC---SMD-SMT_Murata-Electronics-Murata-Electronics-GRT188R61E106ME13D_C697423.html
footprint CAP-0603 (0603 (1608M) Capacitor)
pins: 1, 2

## GRT188R61E225KE13D
designator C?  Capacitance: 2.2uF  (hidden comment: *)
Capacitor, Ceramic (MLCC), 2.2uF, ±10%, 25V, ±10%, SMD 0603; Manufacturer: Murata Electronics; Manufacturer Part Number: GRT188R61E225KE13D; Package Size: 0603; JLCPCB Basic Part: No; JLCPCB Part Number: C907964; Supplier 1: LCSC; Category: Capacitors - MLCC; Supplier Part Number 1: C907964; Tolerance: ±10%; Voltage Rating: 25V; RoHS: Yes; ComponentLink1Description: Datasheet; ComponentLink1URL: https://wmsc.lcsc.com/wmsc/upload/file/pdf/v2/lcsc/2304140030_Murata-Electronics-GRT188R61E225KE13D_C907964.pdf; ComponentLink2Description: JLCPCB Part URL; ComponentLink2URL: https://jlcpcb.com/partdetail/C907964; ComponentLink3Description: LCSC Part URL; ComponentLink3URL: https://lcsc.com/product-detail/Multilayer-Ceramic-Capacitors-MLCC---SMD-SMT_Murata-Electronics-Murata-Electronics-GRT188R61E225KE13D_C907964.html
footprint CAP-0603 (0603 (1608M) Capacitor)
pins: 1, 2

## GRT188R61E475KE13D
designator C?  Capacitance: 4.7uF  (hidden comment: *)
Capacitor, Ceramic (MLCC), 4.7uF, ±10%, 25V, X5R, ±10%, SMD 0603; Manufacturer: Murata Electronics; Manufacturer Part Number: GRT188R61E475KE13D; Package Size: 0603; JLCPCB Basic Part: No; JLCPCB Part Number: C437575; Supplier 1: LCSC; Category: Capacitors - MLCC; Supplier Part Number 1: C437575; Tolerance: ±10%; Voltage Rating: 25V; Temperature Coefficient: X5R; RoHS: Yes; ComponentLink1Description: Datasheet; ComponentLink1URL: https://wmsc.lcsc.com/wmsc/upload/file/pdf/v2/lcsc/2304140030_Murata-Electronics-GRT188R61E475KE13D_C437575.pdf; ComponentLink2Description: JLCPCB Part URL; ComponentLink2URL: https://jlcpcb.com/partdetail/C437575; ComponentLink3Description: LCSC Part URL; ComponentLink3URL: https://lcsc.com/product-detail/Multilayer-Ceramic-Capacitors-MLCC---SMD-SMT_Murata-Electronics-Murata-Electronics-GRT188R61E475KE13D_C437575.html
footprint CAP-0603 (0603 (1608M) Capacitor)
pins: 1, 2

## GRT188R61H105KE13D
designator C?  Capacitance: 1uF  (hidden comment: *)
Capacitor, Ceramic (MLCC), 1uF, ±10%, 50V, X5R, ±10%, SMD 0603; Manufacturer: Murata Electronics; Manufacturer Part Number: GRT188R61H105KE13D; Package Size: 0603; JLCPCB Basic Part: No; JLCPCB Part Number: C126631; Supplier 1: LCSC; Category: Capacitors - MLCC; Supplier Part Number 1: C126631; Tolerance: ±10%; Voltage Rating: 50V; Temperature Coefficient: X5R; RoHS: Yes; ComponentLink1Description: Datasheet; ComponentLink1URL: https://wmsc.lcsc.com/wmsc/upload/file/pdf/v2/lcsc/1810311134_Murata-Electronics-GRT188R61H105KE13D_C126631.pdf; ComponentLink2Description: JLCPCB Part URL; ComponentLink2URL: https://jlcpcb.com/partdetail/C126631; ComponentLink3Description: LCSC Part URL; ComponentLink3URL: https://lcsc.com/product-detail/Multilayer-Ceramic-Capacitors-MLCC---SMD-SMT_Murata-Electronics-Murata-Electronics-GRT188R61H105KE13D_C126631.html
footprint CAP-0603 (0603 (1608M) Capacitor)
pins: 1, 2

## GRT188R61H225KE13D
designator C?  Capacitance: 2.2uF  (hidden comment: *)
Capacitor, Ceramic (MLCC), 2.2uF, ±10%, null, ±10%, SMD 0603; Manufacturer: Murata Electronics; Manufacturer Part Number: GRT188R61H225KE13D; Package Size: 0603; JLCPCB Basic Part: No; JLCPCB Part Number: C668370; Supplier 1: LCSC; Category: Capacitors - MLCC; Supplier Part Number 1: C668370; Tolerance: ±10%; Voltage Rating: null; RoHS: Yes; ComponentLink1Description: Datasheet; ComponentLink1URL: https://wmsc.lcsc.com/wmsc/upload/file/pdf/v2/lcsc/2105241313_Murata-Electronics-GRT188R61H225KE13D_C668370.pdf; ComponentLink2Description: JLCPCB Part URL; ComponentLink2URL: https://jlcpcb.com/partdetail/C668370; ComponentLink3Description: LCSC Part URL; ComponentLink3URL: https://lcsc.com/product-detail/Multilayer-Ceramic-Capacitors-MLCC---SMD-SMT_Murata-Electronics-Murata-Electronics-GRT188R61H225KE13D_C668370.html
footprint CAP-0603 (0603 (1608M) Capacitor)
pins: 1, 2

## GRT188R61H225ME13D
designator C?  Capacitance: 2.2uF  (hidden comment: *)
Capacitor, Ceramic (MLCC), 2.2uF, ±20%, 50V, X5R, ±20%, SMD 0603; Manufacturer: Murata Electronics; Manufacturer Part Number: GRT188R61H225ME13D; Package Size: 0603; JLCPCB Basic Part: No; JLCPCB Part Number: C126632; Supplier 1: LCSC; Category: Capacitors - MLCC; Supplier Part Number 1: C126632; Tolerance: ±20%; Voltage Rating: 50V; Temperature Coefficient: X5R; RoHS: Yes; ComponentLink1Description: Datasheet; ComponentLink1URL: https://wmsc.lcsc.com/wmsc/upload/file/pdf/v2/lcsc/1810311120_Murata-Electronics-GRT188R61H225ME13D_C126632.pdf; ComponentLink2Description: JLCPCB Part URL; ComponentLink2URL: https://jlcpcb.com/partdetail/C126632; ComponentLink3Description: LCSC Part URL; ComponentLink3URL: https://lcsc.com/product-detail/Multilayer-Ceramic-Capacitors-MLCC---SMD-SMT_Murata-Electronics-Murata-Electronics-GRT188R61H225ME13D_C126632.html
footprint CAP-0603 (0603 (1608M) Capacitor)
pins: 1, 2

## GRT188R71E105KE13D
designator C?  Capacitance: 1uF  (hidden comment: *)
Capacitor, Ceramic (MLCC), 1uF, ±10%, 25V, ±10%, SMD 0603; Manufacturer: Murata Electronics; Manufacturer Part Number: GRT188R71E105KE13D; Package Size: 0603; JLCPCB Basic Part: No; JLCPCB Part Number: C701259; Supplier 1: LCSC; Category: Capacitors - MLCC; Supplier Part Number 1: C701259; Tolerance: ±10%; Voltage Rating: 25V; RoHS: Yes; ComponentLink1Description: Datasheet; ComponentLink1URL: https://wmsc.lcsc.com/wmsc/upload/file/pdf/v2/lcsc/2304140030_Murata-Electronics-GRT188R71E105KE13D_C701259.pdf; ComponentLink2Description: JLCPCB Part URL; ComponentLink2URL: https://jlcpcb.com/partdetail/C701259; ComponentLink3Description: LCSC Part URL; ComponentLink3URL: https://lcsc.com/product-detail/Multilayer-Ceramic-Capacitors-MLCC---SMD-SMT_Murata-Electronics-Murata-Electronics-GRT188R71E105KE13D_C701259.html
footprint CAP-0603 (0603 (1608M) Capacitor)
pins: 1, 2

## GRT188R71H103KE01D
designator C?  Capacitance: 10nF  (hidden comment: *)
Capacitor, Ceramic (MLCC), 10nF, ±10%, null, ±10%, SMD 0603; Manufacturer: Murata Electronics; Manufacturer Part Number: GRT188R71H103KE01D; Package Size: 0603; JLCPCB Basic Part: No; JLCPCB Part Number: C782174; Supplier 1: LCSC; Category: Capacitors - MLCC; Supplier Part Number 1: C782174; Tolerance: ±10%; Voltage Rating: null; RoHS: Yes; ComponentLink1Description: Datasheet; ComponentLink1URL: https://wmsc.lcsc.com/wmsc/upload/file/pdf/v2/lcsc/2009161209_Murata-Electronics-GRT188R71H103KE01D_C782174.pdf; ComponentLink2Description: JLCPCB Part URL; ComponentLink2URL: https://jlcpcb.com/partdetail/C782174; ComponentLink3Description: LCSC Part URL; ComponentLink3URL: https://lcsc.com/product-detail/Multilayer-Ceramic-Capacitors-MLCC---SMD-SMT_Murata-Electronics-Murata-Electronics-GRT188R71H103KE01D_C782174.html
footprint CAP-0603 (0603 (1608M) Capacitor)
pins: 1, 2

## GRT188R71H104KE13D
designator C?  Capacitance: 100nF  (hidden comment: *)
Capacitor, Ceramic (MLCC), 100nF, ±10%, null, X7R, ±10%, SMD 0603; Manufacturer: Murata Electronics; Manufacturer Part Number: GRT188R71H104KE13D; Package Size: 0603; JLCPCB Basic Part: No; JLCPCB Part Number: C782175; Supplier 1: LCSC; Category: Capacitors - MLCC; Supplier Part Number 1: C782175; Tolerance: ±10%; Voltage Rating: null; Temperature Coefficient: X7R; RoHS: Yes; ComponentLink1Description: Datasheet; ComponentLink1URL: https://wmsc.lcsc.com/wmsc/upload/file/pdf/v2/lcsc/2009161209_Murata-Electronics-GRT188R71H104KE13D_C782175.pdf; ComponentLink2Description: JLCPCB Part URL; ComponentLink2URL: https://jlcpcb.com/partdetail/C782175; ComponentLink3Description: LCSC Part URL; ComponentLink3URL: https://lcsc.com/product-detail/Multilayer-Ceramic-Capacitors-MLCC---SMD-SMT_Murata-Electronics-Murata-Electronics-GRT188R71H104KE13D_C782175.html
footprint CAP-0603 (0603 (1608M) Capacitor)
pins: 1, 2

## GRT1885C1E103FA02D
designator C?  Capacitance: 10nF  (hidden comment: *)
Capacitor, Ceramic (MLCC), 10nF, ±1%, 25V, C0G, ±1%, SMD 0603; Manufacturer: Murata Electronics; Manufacturer Part Number: GRT1885C1E103FA02D; Package Size: 0603; JLCPCB Basic Part: No; JLCPCB Part Number: C3836718; Supplier 1: LCSC; Category: Capacitors - MLCC; Supplier Part Number 1: C3836718; Tolerance: ±1%; Voltage Rating: 25V; Temperature Coefficient: C0G; RoHS: Yes; ComponentLink1Description: Datasheet; ComponentLink1URL: https://wmsc.lcsc.com/wmsc/upload/file/pdf/v2/lcsc/2308111742_Murata-Electronics-GRT1885C1E103FA02D_C3836718.pdf; ComponentLink2Description: JLCPCB Part URL; ComponentLink2URL: https://jlcpcb.com/partdetail/C3836718; ComponentLink3Description: LCSC Part URL; ComponentLink3URL: https://lcsc.com/product-detail/Multilayer-Ceramic-Capacitors-MLCC---SMD-SMT_Murata-Electronics-Murata-Electronics-GRT1885C1E103FA02D_C3836718.html
footprint CAP-0603 (0603 (1608M) Capacitor)
pins: 1, 2

## HGC0603G01R5C500NTHJ
designator C?  Capacitance: 1.5pF  (hidden comment: *)
Capacitor, Ceramic (MLCC), 1.5pF, 50V, C0G, SMD 0603; Manufacturer: Chinocera; Manufacturer Part Number: HGC0603G01R5C500NTHJ; Package Size: 0603; JLCPCB Basic Part: No; JLCPCB Part Number: C5186670; Supplier 1: LCSC; Category: Capacitors - MLCC; Supplier Part Number 1: C5186670; Voltage Rating: 50V; Temperature Coefficient: C0G; RoHS: Yes; ComponentLink1Description: Datasheet; ComponentLink1URL: https://wmsc.lcsc.com/wmsc/upload/file/pdf/v2/lcsc/2403201120_Chinocera-HGC0603G01R5C500NTHJ_C5186670.pdf; ComponentLink2Description: JLCPCB Part URL; ComponentLink2URL: https://jlcpcb.com/partdetail/C5186670; ComponentLink3Description: LCSC Part URL; ComponentLink3URL: https://lcsc.com/product-detail/Multilayer-Ceramic-Capacitors-MLCC---SMD-SMT_Chinocera-Chinocera-HGC0603G01R5C500NTHJ_C5186670.html
footprint CAP-0603 (0603 (1608M) Capacitor)
pins: 1, 2

## HGC0603G06R4C500NTHJ
designator C?  Capacitance: 6.4pF  (hidden comment: *)
Capacitor, Ceramic (MLCC), 6.4pF, 50V, C0G, SMD 0603; Manufacturer: Chinocera; Manufacturer Part Number: HGC0603G06R4C500NTHJ; Package Size: 0603; JLCPCB Basic Part: No; JLCPCB Part Number: C5186905; Supplier 1: LCSC; Category: Capacitors - MLCC; Supplier Part Number 1: C5186905; Voltage Rating: 50V; Temperature Coefficient: C0G; RoHS: Yes; ComponentLink1Description: Datasheet; ComponentLink1URL: https://wmsc.lcsc.com/wmsc/upload/file/pdf/v2/lcsc/2403201121_Chinocera-HGC0603G06R4C500NTHJ_C5186905.pdf; ComponentLink2Description: JLCPCB Part URL; ComponentLink2URL: https://jlcpcb.com/partdetail/C5186905; ComponentLink3Description: LCSC Part URL; ComponentLink3URL: https://lcsc.com/product-detail/Multilayer-Ceramic-Capacitors-MLCC---SMD-SMT_Chinocera-Chinocera-HGC0603G06R4C500NTHJ_C5186905.html
footprint CAP-0603 (0603 (1608M) Capacitor)
pins: 1, 2

## HGC0603G0100J500NTHJ
designator C?  Capacitance: 10pF  (hidden comment: *)
Capacitor, Ceramic (MLCC), 10pF, ±5%, 50V, C0G, ±5%, SMD 0603; Manufacturer: Chinocera; Manufacturer Part Number: HGC0603G0100J500NTHJ; Package Size: 0603; JLCPCB Basic Part: No; JLCPCB Part Number: C465154; Supplier 1: LCSC; Category: Capacitors - MLCC; Supplier Part Number 1: C465154; Tolerance: ±5%; Voltage Rating: 50V; Temperature Coefficient: C0G; RoHS: Yes; ComponentLink1Description: Datasheet; ComponentLink1URL: https://wmsc.lcsc.com/wmsc/upload/file/pdf/v2/lcsc/2403201120_Chinocera-HGC0603G0100J500NTHJ_C465154.pdf; ComponentLink2Description: JLCPCB Part URL; ComponentLink2URL: https://jlcpcb.com/partdetail/C465154; ComponentLink3Description: LCSC Part URL; ComponentLink3URL: https://lcsc.com/product-detail/Multilayer-Ceramic-Capacitors-MLCC---SMD-SMT_Chinocera-Chinocera-HGC0603G0100J500NTHJ_C465154.html
footprint CAP-0603 (0603 (1608M) Capacitor)
pins: 1, 2

## HGC0603G0120J500NTHJ
designator C?  Capacitance: 12pF  (hidden comment: *)
Capacitor, Ceramic (MLCC), 12pF, ±5%, 50V, C0G, ±5%, SMD 0603; Manufacturer: Chinocera; Manufacturer Part Number: HGC0603G0120J500NTHJ; Package Size: 0603; JLCPCB Basic Part: No; JLCPCB Part Number: C482468; Supplier 1: LCSC; Category: Capacitors - MLCC; Supplier Part Number 1: C482468; Tolerance: ±5%; Voltage Rating: 50V; Temperature Coefficient: C0G; RoHS: Yes; ComponentLink1Description: Datasheet; ComponentLink1URL: https://wmsc.lcsc.com/wmsc/upload/file/pdf/v2/lcsc/2403201120_Chinocera-HGC0603G0120J500NTHJ_C482468.pdf; ComponentLink2Description: JLCPCB Part URL; ComponentLink2URL: https://jlcpcb.com/partdetail/C482468; ComponentLink3Description: LCSC Part URL; ComponentLink3URL: https://lcsc.com/product-detail/Multilayer-Ceramic-Capacitors-MLCC---SMD-SMT_Chinocera-Chinocera-HGC0603G0120J500NTHJ_C482468.html
footprint CAP-0603 (0603 (1608M) Capacitor)
pins: 1, 2

## HGC0603G0150J500NTHJ
designator C?  Capacitance: 15pF  (hidden comment: *)
Capacitor, Ceramic (MLCC), 15pF, ±5%, 50V, C0G, ±5%, SMD 0603; Manufacturer: Chinocera; Manufacturer Part Number: HGC0603G0150J500NTHJ; Package Size: 0603; JLCPCB Basic Part: No; JLCPCB Part Number: C465156; Supplier 1: LCSC; Category: Capacitors - MLCC; Supplier Part Number 1: C465156; Tolerance: ±5%; Voltage Rating: 50V; Temperature Coefficient: C0G; RoHS: Yes; ComponentLink1Description: Datasheet; ComponentLink1URL: https://wmsc.lcsc.com/wmsc/upload/file/pdf/v2/lcsc/2403201120_Chinocera-HGC0603G0150J500NTHJ_C465156.pdf; ComponentLink2Description: JLCPCB Part URL; ComponentLink2URL: https://jlcpcb.com/partdetail/C465156; ComponentLink3Description: LCSC Part URL; ComponentLink3URL: https://lcsc.com/product-detail/Multilayer-Ceramic-Capacitors-MLCC---SMD-SMT_Chinocera-Chinocera-HGC0603G0150J500NTHJ_C465156.html
footprint CAP-0603 (0603 (1608M) Capacitor)
pins: 1, 2
